# Altium footprint library PcbLib.PcbLib: 154 footprints (part 10 of 10)
Each footprint in its own frame and in the unit in brackets; x right, y up, seen from the top. Pads: shape width x height; smd on the part's side, far side on the other; paste and mask are expansions set on the pad; w line width, h text height; cw(c..) or ccw(c..) is an arc to the next point about the centre after c.
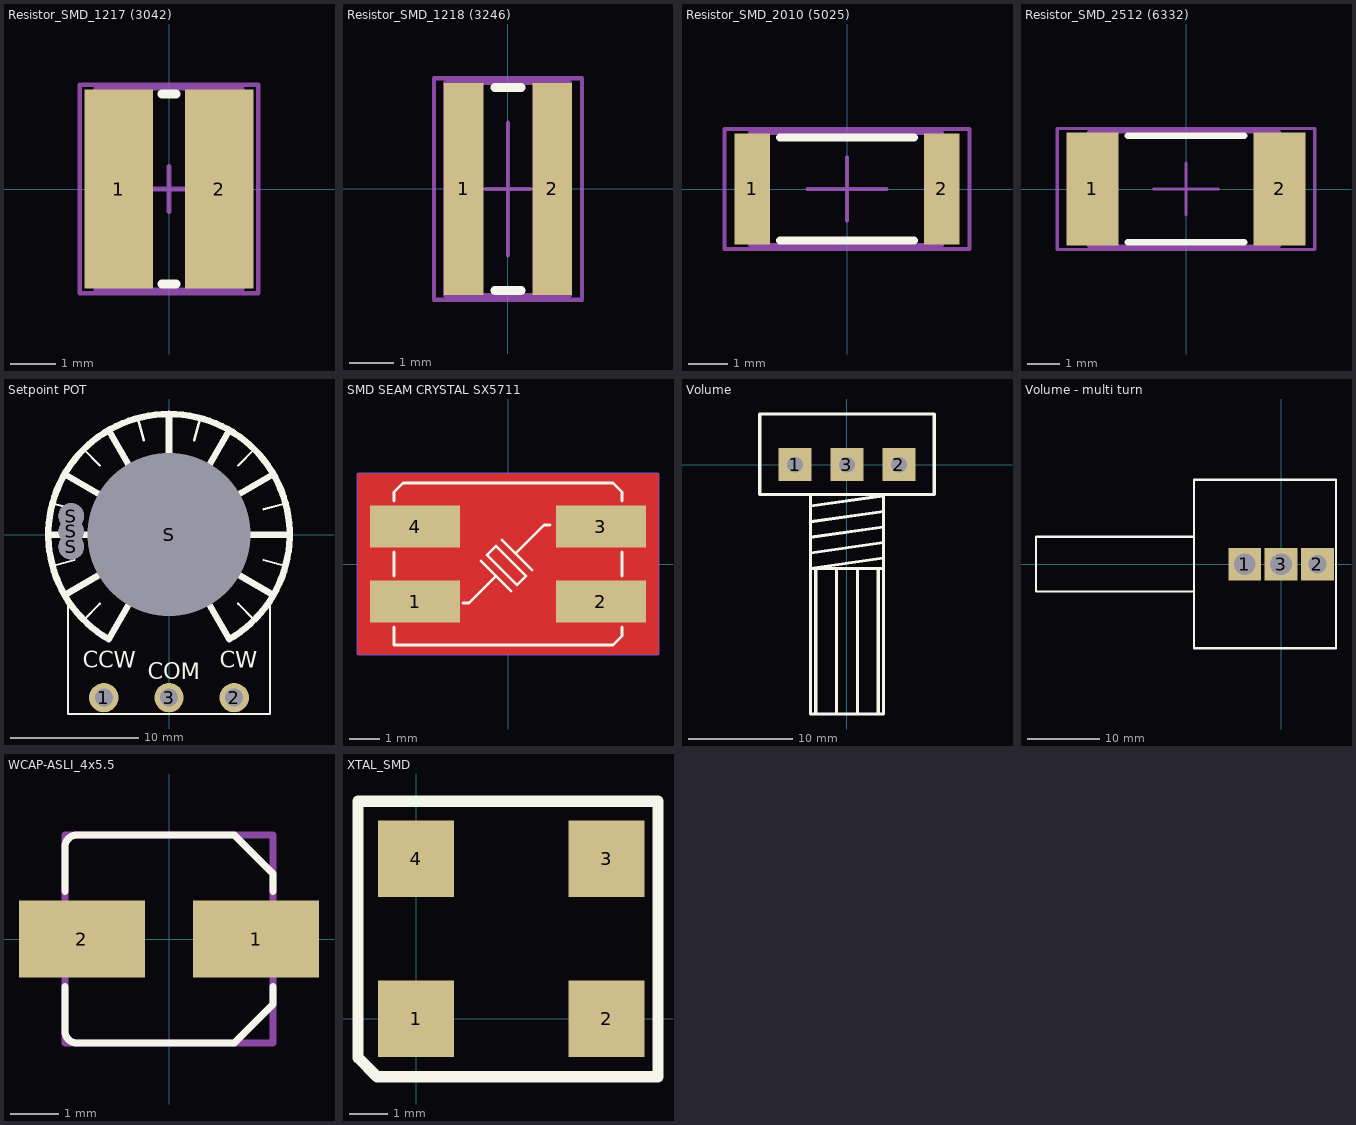
[diagram p9: the footprints below, top view; thin cyan lines are the x and y axes]

## Resistor_SMD_1217 (3042) [mm] "Chip Resistor, 2-Leads, Body 3.0x4.2mm, IPC High Density _ (0.250 W)"
height 0.9
pads (2):
  rect 1.5x4.35 smd: 1(-1.1,0) 2(1.1,0)
Top Overlay:
  lines w0.2: -0.15,-2.075 0.15,-2.075 ; -0.15,2.075 0.15,2.075
Mechanical 13:
  lines w0.1: -1.6,-2.2 -1.6,2.2 1.6,2.2 1.6,-2.2 -1.6,-2.2
Mechanical 15:
  lines w0.1: -0.5,0 0.5,0 ; 0,-0.5 0,0.5 ; -1.95,-2.275 -1.95,2.275 1.95,2.275 1.95,-2.275 -1.95,-2.275
3D body "1217.STEP": height 0.9, standoff 0, extent -1.524,-2.159 1.524,2.159

## Resistor_SMD_1218 (3246) [mm]
pads (2):
  rect 0.9x4.8 smd: 1(-1,0) 2(1,0)
Top Overlay:
  lines w0.2: -0.3,-2.3 0.3,-2.3 ; -0.3,2.3 0.3,2.3
Mechanical 13:
  lines w0.1: -1.422,-2.413 1.397,-2.413 1.397,2.413 -1.422,2.413 -1.422,-2.413
Mechanical 15:
  lines w0.1: -0.5,0 0.5,0 ; 0,-1.5 0,1.5 ; -1.676,-2.515 1.676,-2.515 1.676,2.515 -1.676,2.515 -1.676,-2.515
3D body "User Library-1218R.STEP": height 0.6, standoff -0.05, extent -1.437,-2.348 1.813,2.452

## Resistor_SMD_2010 (5025) [mm]
pads (2):
  rect 0.9x2.8 smd: 1(-2.4,0) 2(2.4,0)
Top Overlay:
  lines w0.2: -1.7,-1.3 1.7,-1.3 ; -1.7,1.3 1.7,1.3
Mechanical 13:
  lines w0.1: -2.464,-1.422 -2.464,1.422 2.413,1.422 2.413,-1.422 -2.464,-1.422
Mechanical 15:
  lines w0.1: -1,0 1,0 ; 0,-0.8 0,0.8 ; -3.099,-1.524 -3.099,1.524 3.099,1.524 3.099,-1.524 -3.099,-1.524
3D body "User Library-R_2010.STEP": height 0.6, standoff 0, extent -2.5,-1.25 2.5,1.25

## Resistor_SMD_2512 (6332) [mm]
pads (2):
  rect 1.6x3.5 smd: 1(-2.9,0) 2(2.9,0)
Top Overlay:
  lines w0.2: -1.8,-1.65 1.8,-1.65 ; -1.8,1.65 1.8,1.65
Mechanical 13:
  lines w0.1: -3.023,-1.778 -3.023,1.778 2.896,1.778 2.896,-1.778 -3.023,-1.778
Mechanical 15:
  lines w0.1: -1,0 1,0 ; 0,-0.8 0,0.8 ; -3.988,-1.88 -3.988,1.88 3.988,1.88 3.988,-1.88 -3.988,-1.88
3D body "User Library-RESC6432X06.STEP": height 0.6, standoff 0, extent -3.2,-1.6 3.2,1.6

## Setpoint POT [mil]
pads (7):
  round 90 hole 55: 1(-200,-500) 2(200,-500) 3(0,-500)
  round 78.74 hole 78.74: S(-300,-37) S(-300,10) S(-300,57)
  round 492.13 hole 500: S(0,0)
Top Overlay:
  lines w7: -357.39,-95.76 -289.78,-77.65 ; -357.39,95.76 -289.78,77.65 ; -310,-200 -310,-550 310,-550 310,-200 ; -261.63,-261.63 -212.13,-212.13 ; -261.63,261.63 -212.13,212.13 ; -95.76,357.39 -77.65,289.78 ; 77.65,289.78 95.76,357.39 ; 212.13,-212.13 261.63,-261.63 ; 212.13,212.13 261.63,261.63 ; 289.78,-77.65 357.39,-95.76 ; 289.78,77.65 357.39,95.76
  lines w20: -370,0 -250,0 ; -320.43,-185 -216.51,-125 ; -320.43,185 -216.51,125 ; -185,320.43 -125,216.51 ; -125,-216.51 -185,-320.43 cw(c0,0) 185,-320.43 125,-216.51 ; 0,250 0,370 ; 125,216.51 185,320.43 ; 216.51,-125 320.43,-185 ; 216.51,125 320.43,185 ; 250,0 370,0
  text "COM" at -65,-443 h50
  text "CW" at 155,-408 h50
  text "CCW" at -264,-408 h50
3D body "POT.STEP": height -636.77, standoff -1642.99, extent -310,-661 310,308.35
3D body "volome cover2.STEP": height 1728.35, standoff 940.94, extent -298.41,-333.62 298.84,289.78

## SMD SEAM CRYSTAL SX5711 [mm] "High frequency stability and reliability.DESIGNER ABBAS BASEREH"
height 1.2
pads (4):
  rect 3x1.4 smd: 1(-3.1,-1.25) 2(3.1,-1.25) 3(3.1,1.25) 4(-3.1,1.25)
Top Layer:
  pour cut-out: -5,3 -5,-3 5,-3 5,3
Top Overlay:
  lines w0.1: -3.8,-2.1 -3.8,-2.7 3.5,-2.7 3.8,-2.4 3.8,-2.1 ; -3.8,-0.4 -3.8,0.4 ; -3.8,2.1 -3.8,2.4 -3.5,2.7 3.5,2.7 3.8,2.4 3.8,2.1 ; -1.5,-1.3 -1.3,-1.3 -0.4,-0.4 ; -0.9,0.1 0.1,-0.9 ; -0.2,0.8 0.8,-0.2 ; 0.3,0.4 1.2,1.3 1.4,1.3 ; 3.8,-0.4 3.8,0.4 ; -0.7,0.3 -0.4,0.6 0.6,-0.4 ; -0.7,0.3 -0.7,0.3 ; -0.7,0.3 0.3,-0.7 0.6,-0.4 ; 0.6,-0.4 0.6,-0.4
Mechanical 15:
  lines w0.1: -0.5,0 0.5,0 ; 0,-0.5 0,0.5 ; -5,-3 5,-3 5,3 -5,3 -5,-3
3D body "User Library-KX-13 7_0x5_0x1_3.STEP": height 1.3, standoff 0, extent -3.525,-2.5 3.475,2.5

## Volume [mm]
pads (3):
  rect 3.2x3.2 hole 1.5: 1(-5,0) 2(5,0) 3(0,0)
Top Overlay:
  lines w0.3: -8.4,-2.864 8.4,-2.864 8.4,4.864 -8.4,4.864 -8.4,-2.864
  lines w0.305: -3.5,-8.5 3.5,-7.5 ; -3.5,-7 3.5,-6 ; -3.5,-5.5 3.5,-4.5 ; -3.5,-4 3.5,-3 3.5,-24 -3.5,-24 -3.5,-3 ; -3,-24 -3,-10 ; -1,-24 -1,-10 ; 1,-24 1,-10 ; 3,-24 3,-10 ; 3.5,-10 -3.5,-10 3.5,-9
3D body "Volum.STEP": height 20.62, standoff -4, extent -7.874,-20.732 7.874,4.826

## Volume - multi turn [mm]
pads (3):
  rect 4.5x4.5 hole 3: 1(-5,0) 3(0,0)
  rect 4.5x4.5 hole 2.5: 2(5,0)
Top Overlay:
  lines w0.3: -11.989,-3.759 -33.68,-3.759 -33.68,3.759 -11.989,3.759 ; -11.989,-11.557 7.544,-11.557 7.544,11.608 -11.989,11.608 -11.989,-11.557
3D body "User Library-Bourns 3590S-2-502L.STEP": height 23.8, standoff -3.03, extent -33.415,-11.3 6.985,11.3

## WCAP-ASLI_4x5.5 [mm]
pads (2):
  rect 2.6x1.6 smd: 1(1.8,0) 2(-1.8,0)
Top Overlay:
  lines w0.15: -2.15,-0.98 -2.15,-1.9 ccw(c-1.9,-1.9) -1.9,-2.15 1.35,-2.15 2.15,-1.35 2.15,-0.98 ; -2.15,0.98 -2.15,1.9 cw(c-1.9,1.9) -1.9,2.15 1.35,2.15 2.15,1.35 2.15,0.98
Mechanical 13:
  lines w0.15: -2.15,-2.15 -2.15,2.15 2.15,2.15 2.15,-2.15 -2.15,-2.15
3D body "4x5.5x1.stp": height 5.5, standoff 0, extent -2.5,-2.15 2.5,2.15

## XTAL_SMD [mm]
pads (4):
  rect 2x2 smd: 1(0,0) 2(5,0) 3(5,4.2) 4(0,4.2)
Top Overlay:
  lines w0.3: -1.524,-1.016 -1.016,-1.524 6.35,-1.524 6.35,-1.27 6.35,5.715 -1.27,5.715 -1.524,5.715 -1.524,-1.016